# Altium footprint library PcbLib1.PcbLib: 62 footprints (part 1 of 4)
Each footprint in its own frame and in the unit in brackets; x right, y up, seen from the top. Pads: shape width x height; smd on the part's side, far side on the other; paste and mask are expansions set on the pad; w line width, h text height; cw(c..) or ccw(c..) is an arc to the next point about the centre after c.
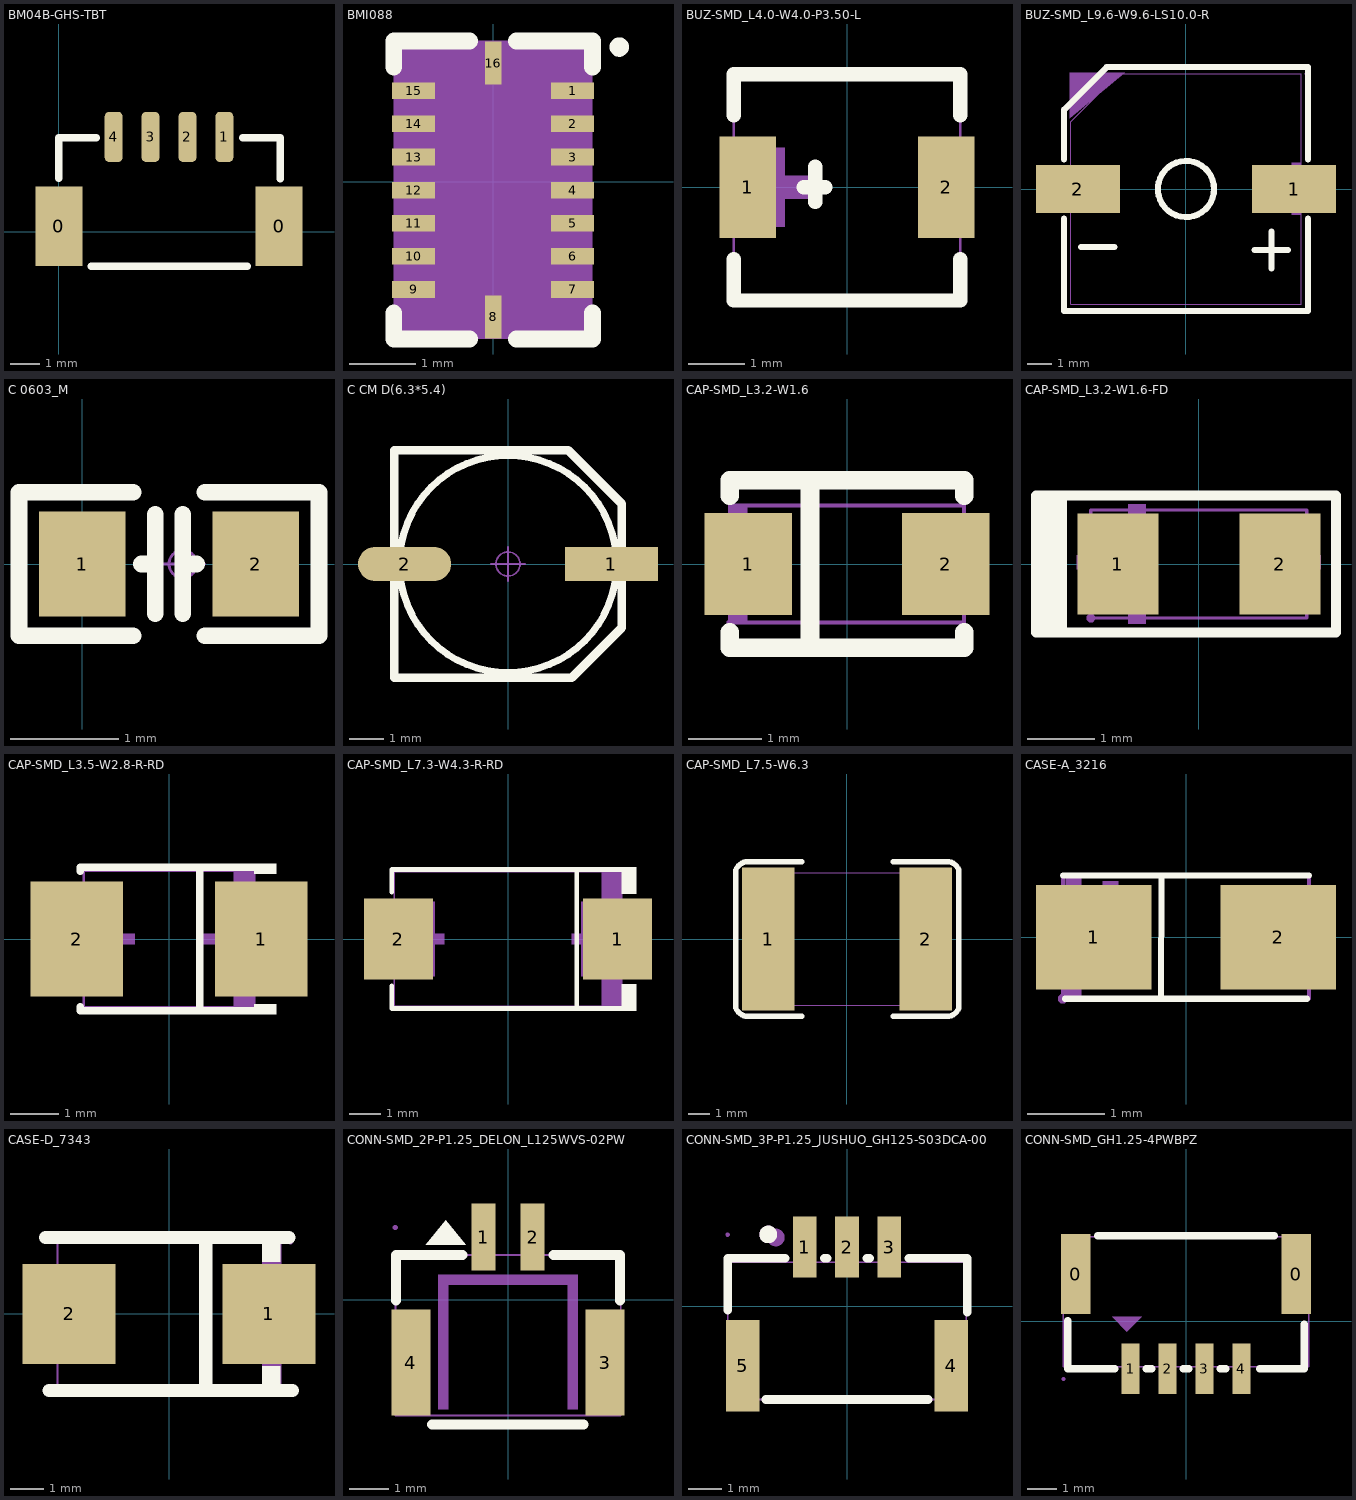
[diagram p0: the footprints below, top view; thin cyan lines are the x and y axes]

## BM04B-GHS-TBT [mm]
height 1.45
pads (6):
  rect 1.6x2.7 smd: 0(0,0.177) 0(7.45,0.177)
  rrect50% 0.6x1.7 smd: 1(5.6,3.2) 2(4.35,3.2) 3(3.1,3.2) 4(1.85,3.2)
Top Overlay:
  lines w0.254: 0,1.803 0,3.175 1.27,3.175 ; 1.092,-1.168 6.375,-1.168 ; 6.223,3.175 7.493,3.175 7.493,1.778
3D body "User Library-SM04B-GHS-TB.STEP": height 4.25, standoff -0.1, extent -0.366,-1.167 7.884,3.683

## BMI088 [mm]
height 5
pads (16):
  rect 0.65x0.25 smd: 1(1.2,1.371) 2(1.2,0.871) 3(1.2,0.371) 4(1.2,-0.129) 5(1.2,-0.629) 6(1.2,-1.129) 7(1.2,-1.629) 9(-1.2,-1.629) 10(-1.2,-1.129) 11(-1.2,-0.629) 12(-1.2,-0.129) 13(-1.2,0.371) 14(-1.2,0.871) 15(-1.2,1.371)
  rect 0.25x0.65 smd: 8(0,-2.042) 16(0,1.788)
Top Overlay:
  circle w0.152: c1.905,2.032 r0.071
  lines w0.254: -1.5,-1.985 -1.5,-2.377 -0.356,-2.377 ; -1.5,1.727 -1.5,2.123 -0.356,2.123 ; 0.356,-2.377 1.5,-2.377 1.5,-1.985 ; 0.356,2.123 1.5,2.123 1.5,1.727
Mechanical 4:
  region: 1.5,2.123 1.5,-2.377 -1.5,-2.377 -1.5,2.123
Mechanical 5:
  region: -0.125,-1.802 0.125,-1.802 0.125,-2.277 -0.125,-2.277
  region: -0.125,2.023 0.125,2.023 0.125,1.548 -0.125,1.548
  region: 0.925,1.496 1.4,1.496 1.4,1.246 0.925,1.246
  region: 0.925,0.996 1.4,0.996 1.4,0.746 0.925,0.746
  region: 0.925,0.496 1.4,0.496 1.4,0.246 0.925,0.246
  region: 0.925,-0.004 1.4,-0.004 1.4,-0.254 0.925,-0.254
  region: 0.925,-0.504 1.4,-0.504 1.4,-0.754 0.925,-0.754
  region: 0.925,-1.004 1.4,-1.004 1.4,-1.254 0.925,-1.254
  region: 0.925,-1.504 1.4,-1.504 1.4,-1.754 0.925,-1.754
  region: -1.4,-1.504 -0.925,-1.504 -0.925,-1.754 -1.4,-1.754
  region: -1.4,-1.004 -0.925,-1.004 -0.925,-1.254 -1.4,-1.254
  region: -1.4,-0.504 -0.925,-0.504 -0.925,-0.754 -1.4,-0.754
  region: -1.4,-0.004 -0.925,-0.004 -0.925,-0.254 -1.4,-0.254
  region: -1.4,0.496 -0.925,0.496 -0.925,0.246 -1.4,0.246
  region: -1.4,0.996 -0.925,0.996 -0.925,0.746 -1.4,0.746
  region: -1.4,1.496 -0.925,1.496 -0.925,1.246 -1.4,1.246
Mechanical 6:
  circle w0.06: c1.5,2.123 r0.03
3D body "LGA-16.STEP": height 1, standoff 0, extent -1.5,-2.377 1.5,2.123

## BUZ-SMD_L4.0-W4.0-P3.50-L [mm]
pads (2):
  rect 1x1.8 smd: 1(-1.75,0) 2(1.75,0)
Top Overlay:
  lines w0.254: -2,-1.27 -2,-2 2,-2 2,-1.27 ; -2,1.27 -2,2 2,2 2,1.27 ; -0.762,0 -0.381,0 ; -0.56,-0.26 -0.56,0.36
Mechanical 6:
  region: -2.1,0.2 -1.5,0.2 -1.5,0.7 -1.1,0.7 -1.1,0.2 -0.5,0.2 -0.5,-0.2 -1.1,-0.2 -1.1,-0.7 -1.5,-0.7 -1.5,-0.2 -2.1,-0.2
Mechanical 15:
  region: -1.94,-2 -1.94,-1.975 -1.975,-1.94 -2.025,-1.94 -2.06,-1.975 -2.06,-2 -2.06,-2.025 -2.025,-2.06 -1.975,-2.06 -1.94,-2.025
  region: 1.5,0.7 2,0.7 2,-0.7 1.5,-0.7
  region: -2,0.7 -1.5,0.7 -1.5,-0.7 -2,-0.7
  lines w0.051: -2,-2 -2,2 2,2 2,-2 -2,-2
3D body "SMD,4x4mm.STEP": height 2.01, standoff 0, extent -2,-2 2,2.01

## BUZ-SMD_L9.6-W9.6-LS10.0-R [mm]
pads (2):
  rect 3.5x2 smd: 1(4.5,0) 2(-4.5,0)
Top Overlay:
  circle w0.254: c0.001,0 r1.171
  lines w0.254: -5.079,-1.232 -5.079,-5.08 5.081,-5.08 5.081,-1.231 ; -5.079,1.232 -5.079,3.302 -3.301,5.08 5.081,5.08 5.081,1.231 ; -4.381,-2.413 -2.984,-2.413 ; 2.858,-2.54 4.255,-2.54 ; 3.557,-3.302 3.557,-1.778
Mechanical 6:
  region: -2.55,4.85 -4.85,4.85 -4.85,2.95
  region: -5.508,0.191 -3.349,0.191 -3.349,-0.191 -5.508,-0.191
  region: 4.41,-1.07 4.41,1.089 4.791,1.089 4.791,-1.07
  region: 3.493,0.191 5.652,0.191 5.652,-0.191 3.493,-0.191
Mechanical 15:
  region: -3.3,-0.75 -5,-0.75 -5,0.75 -3.3,0.75
  region: 3.3,0.75 5,0.75 5,-0.75 3.3,-0.75
  region: 5.06,4.8 5.06,4.825 5.025,4.86 4.975,4.86 4.94,4.825 4.94,4.8 4.94,4.775 4.975,4.74 5.025,4.74 5.06,4.775
  lines w0.051: -4.8,-4.8 -4.8,2.8 -2.8,4.8 4.8,4.8 4.8,-4.8 -4.8,-4.8

## C 0603_M [mm] "无极性贴片电容"
pads (2):
  rect 0.8x0.965 smd: 1(0,0) 2(1.6,0)
Top Overlay:
  lines w0.152: 0.47,-0.66 -0.584,-0.66 -0.584,0.66 0.47,0.66 ; 0.546,0 0.673,0 ; 0.673,-0.457 0.673,0.457 ; 0.927,-0.457 0.927,0.457 ; 0.927,0 1.054,0 ; 1.13,-0.66 2.184,-0.66 2.184,0.66 1.13,0.66
Mechanical 15:
  circle w0.025: c0.927,0 r0.127
  lines w0.025: 0.727,0 1.127,0 ; 0.927,-0.2 0.927,0.2
3D body "C 0603.STEP": height 0.81, standoff -0.01, extent -0.013,-0.41 1.587,0.41

## C CM D(6.3*5.4) [mm] "贴片电解电容，直径6.3mm，高5.4mm"
height 5.4
pads (2):
  rect 2.7x1 smd: 1(3,0)
  oval 2.7x1 smd: 2(-3,0)
Top Overlay:
  circle w0.2: c0,0 r3.15
  lines w0.254: -3.3,-3.3 1.85,-3.3 3.3,-1.85 3.3,1.75 1.75,3.3 -3.3,3.3 -3.3,-3.3
Mechanical 15:
  circle w0.05: c0,0 r0.35
  lines w0.05: -0.5,0 0.5,0 ; 0,-0.5 0,0.5
3D body "CM D(6.3X5.4).STEP": height 5.4, standoff -0.01, extent -3.5,-3.3 3.5,3.3

## CAP-SMD_L3.2-W1.6 [mm] "47uF ±20% 6.3V  钽电容"
pads (2):
  rect 1.2x1.4 smd: 1(-1.35,0) 2(1.35,0)
Top Overlay:
  region: -0.635,1.143 -0.381,1.143 -0.381,-1.143 -0.508,-1.143 -0.635,-1.143
  lines w0.254: -1.6,-0.931 -1.6,-1.143 -0.128,-1.143 1.6,-1.143 1.6,-0.931 ; -1.6,0.931 -1.6,1.143 1.6,1.143 1.6,0.931
Mechanical 6:
  region: -1.6,-0.8 -1.6,-0.4 -1.36,-0.4 -1.36,-0.8
  region: -1.6,0.8 -1.6,0.4 -1.36,0.4 -1.36,0.8
  region: -1.3,0.4 -1.3,-0.4 -1.18,-0.4 -1.18,0.4
  region: -1.48,0.06 -1.48,-0.06 -1,-0.06 -1,0.06
  region: 1.48,0.06 1.48,-0.06 1,-0.06 1,0.06
Mechanical 15:
  region: -1.56,-0.8 -1.56,-0.784 -1.583,-0.76 -1.617,-0.76 -1.64,-0.784 -1.64,-0.8 -1.64,-0.817 -1.617,-0.84 -1.583,-0.84 -1.56,-0.817
  region: 0.8,0.6 1.6,0.6 1.6,-0.6 0.8,-0.6
  region: -0.8,-0.6 -1.6,-0.6 -1.6,0.6 -0.8,0.6
  lines w0.051: -1.6,-0.8 1.6,-0.8 1.6,0.8 -1.6,0.8 -1.6,-0.8
3D body "CASE-A-3216.STEP": height 1.69, standoff -0.01, extent -1.6,-0.8 1.6,0.8

## CAP-SMD_L3.2-W1.6-FD [mm] "48uf坦电容"
pads (2):
  rect 1.2x1.5 smd: 1(-1.2,0) 2(1.2,0)
Top Overlay:
  region: -2.032,1.016 -2.032,-1.016 -2.413,-1.016 -2.413,1.016
  lines w0.152: -2.032,-1.016 2.032,-1.016 2.032,1.016 -2.032,1.016 ; -2.032,-1.016 -2.032,1.016 ; -2.032,-1.016 -2.413,-1.016 -2.413,1.016 -2.032,1.016
Mechanical 6:
  region: -0.79,0.381 -0.79,0.889 -1.044,0.889 -1.044,0.381
  region: -0.79,-0.889 -0.79,-0.381 -1.044,-0.381 -1.044,-0.889
  region: -1.806,0.127 -1.019,0.127 -1.019,-0.076 -1.806,-0.076
  region: -1.501,-0.394 -1.501,0.394 -1.298,0.394 -1.298,-0.394
  region: 1.016,0.127 1.803,0.127 1.803,-0.076 1.016,-0.076
Mechanical 15:
  region: 0.8,0.6 1.6,0.6 1.6,-0.6 0.8,-0.6
  region: -1.6,0.6 -0.8,0.6 -0.8,-0.6 -1.6,-0.6
  region: -1.54,-0.8 -1.54,-0.775 -1.575,-0.74 -1.625,-0.74 -1.66,-0.775 -1.66,-0.8 -1.66,-0.825 -1.625,-0.86 -1.575,-0.86 -1.54,-0.825
  lines w0.051: -1.6,-0.8 1.6,-0.8 1.6,0.8 -1.6,0.8 -1.6,-0.8

## CAP-SMD_L3.5-W2.8-R-RD [mm]
pads (2):
  rect 1.9x2.376 smd: 1(1.899,0) 2(-1.899,0)
Top Overlay:
  region: 1.75,1.552 1.75,1.34 2.207,1.34 2.207,1.552
  region: 1.75,-1.552 1.75,-1.34 2.207,-1.34 2.207,-1.552
  lines w0.152: -1.826,-1.391 -1.826,-1.476 1.826,-1.476 ; -1.826,1.391 -1.826,1.476 1.826,1.476 ; 0.635,-1.476 0.635,1.476
Mechanical 6:
  region: -1.54,-0.105 -1.54,0.105 -0.7,0.105 -0.7,-0.105
  region: 1.54,-0.105 1.54,0.105 0.7,0.105 0.7,-0.105
  region: 1.225,-0.7 1.225,0.7 1.015,0.7 1.015,-0.7
  region: 1.75,-1.4 1.75,-0.7 1.33,-0.7 1.33,-1.4
  region: 1.75,1.4 1.75,0.7 1.33,0.7 1.33,1.4
Mechanical 15:
  region: 1.81,1.4 1.81,1.425 1.775,1.46 1.725,1.46 1.69,1.425 1.69,1.4 1.69,1.375 1.725,1.34 1.775,1.34 1.81,1.375
  region: -1.75,-1.1 -1.75,1.1 -1.05,1.1 -1.05,-1.1
  region: 1.75,-1.1 1.75,1.1 1.05,1.1 1.05,-1.1
  lines w0.051: -1.75,-1.4 -1.75,1.4 1.75,1.4 1.75,-1.4 -1.75,-1.4
3D body "CASE-B-3528.STEP": height 1.97, standoff -0.03, extent -1.85,-1.4 1.85,1.4

## CAP-SMD_L7.3-W4.3-R-RD [mm] "10uF ±10% 50V 坦电容"
pads (2):
  rect 2.207x2.592 smd: 1(3.511,0) 2(-3.511,0)
Top Overlay:
  region: 3.65,2.302 3.65,1.448 4.107,1.448 4.107,2.302
  region: 3.65,-2.302 3.65,-1.448 4.107,-1.448 4.107,-2.302
  lines w0.152: -3.726,-1.499 -3.726,-2.226 3.726,-2.226 ; -3.726,1.499 -3.726,2.226 3.726,2.226 ; 2.204,-2.226 2.204,2.226
Mechanical 6:
  region: -3.328,-0.161 -3.328,0.161 -2.038,0.161 -2.038,-0.161
  region: 3.328,-0.161 3.328,0.161 2.038,0.161 2.038,-0.161
  region: 2.844,-1.075 2.844,1.075 2.521,1.075 2.521,-1.075
  region: 3.65,-2.15 3.65,-1.075 3.005,-1.075 3.005,-2.15
  region: 3.65,2.15 3.65,1.075 3.005,1.075 3.005,2.15
Mechanical 15:
  region: -3.65,-1.2 -3.65,1.2 -2.35,1.2 -2.35,-1.2
  region: 3.65,-1.2 3.65,1.2 2.35,1.2 2.35,-1.2
  region: 3.71,-2.12 3.71,-2.095 3.675,-2.06 3.625,-2.06 3.59,-2.095 3.59,-2.12 3.59,-2.145 3.625,-2.18 3.675,-2.18 3.71,-2.145
  lines w0.051: -3.65,-2.15 -3.65,2.15 3.65,2.15 3.65,-2.15 -3.65,-2.15
3D body "CASE-D_7343666.STEP": height 4.21, standoff -0.04, extent -3.65,-2.15 3.65,2.15

## CAP-SMD_L7.5-W6.3 [mm] "22uF ±20% 50V"
pads (2):
  rect 2.5x6.8 smd: 1(-3.75,0) 2(3.75,0)
Top Overlay:
  lines w0.254: -2.159,-3.683 -4.826,-3.683 cw(c-4.699,-3.048) -5.3,-3.289 -5.3,3.289 cw(c-4.699,3.048) -4.826,3.683 -2.159,3.683 ; 2.193,-3.683 4.86,-3.683 ccw(c4.733,-3.048) 5.334,-3.289 5.334,3.289 ccw(c4.733,3.048) 4.86,3.683 2.193,3.683
Mechanical 15:
  region: -3.69,-3.15 -3.69,-3.125 -3.725,-3.09 -3.775,-3.09 -3.81,-3.125 -3.81,-3.15 -3.81,-3.175 -3.775,-3.21 -3.725,-3.21 -3.69,-3.175
  region: -3.75,3.15 -3.15,3.15 -3.15,-3.15 -3.75,-3.15
  region: 3.15,3.15 3.75,3.15 3.75,-3.15 3.15,-3.15
  lines w0.051: -3.75,-3.15 -3.75,3.15 3.75,3.15 3.75,-3.15 -3.75,-3.15

## CASE-A_3216 [mm]
pads (2):
  rect 1.5x1.359 smd: 1(-1.2,0) 2(1.2,0)
Top Overlay:
  lines w0.08: -1.6,0.8 1.6,0.8 ; -1.575,-0.8 1.575,-0.8 ; -0.323,-0.8 -0.32,0.8
Mechanical 6:
  region: 1.501,0.13 1.501,-0.08 0.661,-0.08 0.661,0.13
  region: -1.563,0.813 -1.36,0.813 -1.36,0.483 -1.563,0.483
  region: -1.363,-0.813 -1.567,-0.813 -1.567,-0.483 -1.363,-0.483
  region: -0.61,0.13 -0.61,-0.08 -1.45,-0.08 -1.45,0.13
  region: -1.081,0.724 -0.878,0.724 -0.878,-0.673 -1.081,-0.673
Mechanical 15:
  region: -1.54,-0.8 -1.54,-0.775 -1.575,-0.74 -1.625,-0.74 -1.66,-0.775 -1.66,-0.8 -1.66,-0.825 -1.625,-0.86 -1.575,-0.86 -1.54,-0.825
  region: -0.8,0.625 -0.8,-0.575 -1.6,-0.575 -1.6,0.625
  region: 1.6,0.625 1.6,-0.575 0.8,-0.575 0.8,0.625
  lines w0.051: -1.6,-0.8 1.6,-0.8 1.6,0.8 -1.6,0.8 -1.6,-0.8
3D body "CASE-A-3216.STEP": height 1.69, standoff -0.01, extent -1.6,-0.8 1.6,0.8

## CASE-D_7343 [mm] "10uf坦电容"
pads (2):
  rect 2.799x3.01 smd: 1(3,0) 2(-3,0)
Top Overlay:
  region: 2.798,2.3 2.798,1.565 3.348,1.565 3.348,2.285 3.333,2.3 3.178,2.3
  region: 3.348,-2.3 3.348,-1.565 2.798,-1.565 2.798,-2.285 2.813,-2.3 2.968,-2.3
  lines w0.4: -3.7,2.3 3.6,2.3 ; -3.6,-2.3 3.7,-2.3 ; 1.1,-2.3 1.101,2.3
Mechanical 6:
  region: -3.6,0.2 -1.9,0.2 -1.9,-0.2 -3.6,-0.2
  region: 1.766,0.245 3.466,0.245 3.466,-0.155 1.766,-0.155
  region: 2.8,0.85 2.8,-0.85 2.4,-0.85 2.4,0.85
  region: 2.8,2.15 2.8,1.205 3.35,1.205 3.35,2.15
  region: 3.35,-2.15 3.35,-1.205 2.8,-1.205 2.8,-2.15
Mechanical 15:
  region: -2.35,-1.2 -3.65,-1.2 -3.65,1.2 -2.35,1.2
  region: 3.65,-1.2 2.35,-1.2 2.35,1.2 3.65,1.2
  region: 3.71,2.15 3.71,2.175 3.675,2.21 3.625,2.21 3.59,2.175 3.59,2.15 3.59,2.125 3.625,2.09 3.675,2.09 3.71,2.125
  lines w0.051: -3.35,-2.15 -3.35,2.15 3.35,2.15 3.35,-2.15 -3.35,-2.15
3D body "CASE-D_7343666.STEP": height 4.21, standoff -0.04, extent -3.655,-2.137 3.645,2.163

## CONN-SMD_2P-P1.25_DELON_L125WVS-02PW [mm]
pads (4):
  rect 0.6x1.7 smd paste+0 mask+0.05: 1(-0.625,1.6) 2(0.625,1.6)
  rect 1x2.7 smd paste+0 mask+0.05: 3(2.475,-1.6) 4(-2.475,-1.6)
Top Overlay:
  region: -1.584,2.032 -2.092,1.397 -1.076,1.397
  lines w0.254: -2.854,-0.019 -2.854,1.143 -1.156,1.143 ; -1.932,-3.175 1.932,-3.175 ; 1.156,1.143 2.854,1.143 2.854,-0.019
Mechanical 6:
  region: -1.778,-2.794 -1.778,0.635 -1.524,0.635 -1.524,-2.794
  region: 1.778,-2.794 1.778,0.635 1.524,0.635 1.524,-2.794
  region: 1.524,0.635 -1.524,0.635 -1.524,0.381 1.524,0.381
Mechanical 15:
  region: -2.815,1.843 -2.815,1.868 -2.85,1.903 -2.9,1.903 -2.935,1.868 -2.935,1.843 -2.935,1.818 -2.9,1.783 -2.85,1.783 -2.815,1.818
  region: -0.725,1.843 -0.525,1.843 -0.525,1.043 -0.725,1.043
  region: 0.525,1.843 0.725,1.843 0.725,1.043 0.525,1.043
  region: -2.585,-0.6 -2.365,-0.6 -2.365,-2.6 -2.585,-2.6
  region: 2.365,-0.6 2.585,-0.6 2.585,-2.6 2.365,-2.6
  lines w0.051: -2.875,-2.957 -2.875,1.143 2.875,1.143 2.875,-2.957 -2.875,-2.957
3D body "SMD,P=1.25mm1.STEP": height 4.29, standoff -0.07, extent -2.875,-3.034 2.875,1.966

## CONN-SMD_3P-P1.25_JUSHUO_GH125-S03DCA-00 [mm]
pads (5):
  rect 0.7x1.8 smd paste+0 mask+0.05: 1(-1.25,1.75) 2(0,1.75) 3(1.25,1.75)
  rect 1x2.7 smd paste+0 mask+0.05: 4(3.08,-1.75) 5(-3.08,-1.75)
Top Overlay:
  circle w0.26: c-2.325,2.125 r0.13
  lines w0.254: -3.525,-0.119 -3.525,1.425 -1.831,1.425 ; -2.4,-2.75 2.4,-2.75 ; -0.669,1.425 -0.581,1.425 ; 0.581,1.425 0.669,1.425 ; 1.831,1.425 3.556,1.425 3.556,-0.169
Mechanical 6:
  circle w0.26: c-2.105,2.035 r0.13
  circle w0.26: c-2.325,2.125 r0.13
Mechanical 15:
  region: -3.18,-0.83 -2.98,-0.83 -2.98,-2.67 -3.18,-2.67
  region: 2.98,-0.83 3.18,-0.83 3.18,-2.67 2.98,-2.67
  region: -1.35,2.12 -1.15,2.12 -1.15,1.12 -1.35,1.12
  region: -0.1,2.12 0.1,2.12 0.1,1.12 -0.1,1.12
  region: 1.15,2.12 1.35,2.12 1.35,1.12 1.15,1.12
  region: -3.465,2.12 -3.465,2.145 -3.5,2.18 -3.55,2.18 -3.585,2.145 -3.585,2.12 -3.585,2.095 -3.55,2.06 -3.5,2.06 -3.465,2.095
  lines w0.051: -3.525,-2.75 3.525,-2.75 3.525,1.3 -3.525,1.3 -3.525,-2.75
3D body "SMD,P=1.25mm.STEP": height 4.29, standoff 0.04, extent -3.525,-2.425 3.526,2.425

## CONN-SMD_GH1.25-4PWBPZ [mm]
pads (6):
  rect 1x2.7 smd paste+0 mask+0.05: 0(-3.725,1.601) 0(3.725,1.601)
  rect 0.6x1.7 smd paste+0 mask+0.05: 1(-1.875,-1.601) 2(-0.625,-1.601) 3(0.625,-1.601) 4(1.875,-1.601)
Top Overlay:
  lines w0.254: -4,0.02 -4,-1.601 -2.5,-1.601 -2.406,-1.601 ; -2.994,2.899 2.994,2.899 ; -1.344,-1.601 -1.156,-1.601 ; -0.094,-1.601 0.094,-1.601 ; 1.156,-1.601 1.344,-1.601 ; 2.5,-1.601 4,-1.601 4,-0.101
Mechanical 6:
  region: -1.5,0.149 -2.5,0.149 -2,-0.351
Mechanical 15:
  region: 3.625,2.851 3.825,2.851 3.825,0.351 3.625,0.351
  region: -3.825,2.851 -3.625,2.851 -3.625,0.351 -3.825,0.351
  region: 1.775,-0.943 1.975,-0.943 1.975,-1.943 1.775,-1.943
  region: 0.525,-0.943 0.725,-0.943 0.725,-1.943 0.525,-1.943
  region: -0.725,-0.943 -0.525,-0.943 -0.525,-1.943 -0.725,-1.943
  region: -1.975,-0.943 -1.775,-0.943 -1.775,-1.943 -1.975,-1.943
  region: -4.09,-1.943 -4.09,-1.918 -4.125,-1.883 -4.175,-1.883 -4.21,-1.918 -4.21,-1.943 -4.21,-1.968 -4.175,-2.003 -4.125,-2.003 -4.09,-1.968
  lines w0.051: -4.15,-1.537 4.15,-1.537 4.15,2.863 -4.15,2.863 -4.15,-1.537
3D body "-.STEP": height 4.25, standoff -0.01, extent -4.096,-1.94 4.155,2.92